# Altium integrated library A.Mohebbi.IntLib: 48 symbols (part 1 of 3)
Pins are listed as number, name and electrical type; pins without a type are passive.

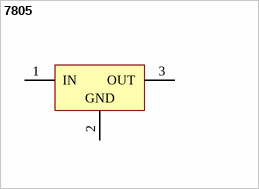
[diagram p0: symbol 7805]

## 7805
designator 7805, comment 7805CV  (value not drawn)
7805; LatestRevisionDate: 17-Jul-2002; LatestRevisionNote: Re-released for DXP Platform.; Publisher: Altium Limited
footprint TO_263
footprint TO_03
footprint TO_220_Right
footprint TO_220.
pins: 1 IN (power), 2 GND (power), 3 OUT (power)


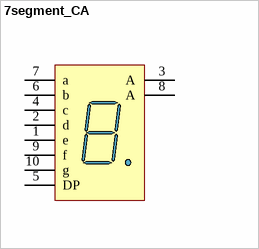
[diagram p1: symbol 7segment_CA]

## 7segment_CA
designator 7seg?  (value not drawn)
LatestRevisionDate: 17-Jul-2002; LatestRevisionNote: Re-released for DXP Platform.; Publisher: Altium Limited
footprint 7segment_CA
pins: 1 e "Cathode", 2 d "Cathode", 3 A "Common Anode", 4 c "Cathode", 5 DP "Cathode", 6 b "Cathode", 7 a "Cathode", 8 A "Common Anode", 9 f "Cathode", 10 g "Cathode"


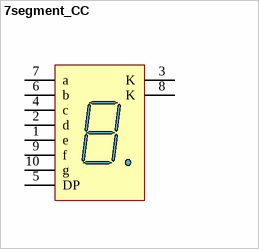
[diagram p2: symbol 7segment_CC]

## 7segment_CC
designator 7seg?  (value not drawn)
LatestRevisionDate: 17-Jul-2002; LatestRevisionNote: Re-released for DXP Platform.; Publisher: Altium Limited
footprint 7segment_CC
pins: 1 e "Anode", 2 d "Anode", 3 K "Common Cathode", 4 c "Anode", 5 DP "Anode", 6 b "Anode", 7 a "Anode", 8 K "Common Cathode", 9 f "Anode", 10 g "Anode"


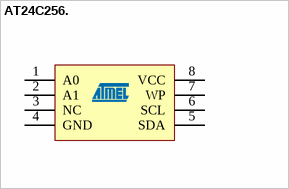
[diagram p3: symbol AT24C256.]

## AT24C256.
designator AT24C256, comment AT24C256  (value not drawn)
LatestRevisionDate: 17-Jul-2002; LatestRevisionNote: Re-released for DXP Platform.; Publisher: Altium Limited
footprint DIP_8
footprint SO_8
pins: 1 A0, 2 A1, 3 NC, 4 GND (power), 5 SDA, 6 SCL, 7 WP, 8 VCC (power)


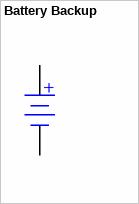
[diagram p4: symbol Battery Backup]

## Battery Backup
designator Battery  (value not drawn)
LatestRevisionDate: 17-Jul-2002; LatestRevisionNote: Re-released for DXP Platform.; Publisher: Altium Limited
footprint Cell Holder
footprint Cell Holder_SMD
pins: 1 + (power), 2 - (power)


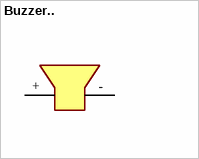
[diagram p5: symbol Buzzer..]

## Buzzer..
designator Buzzer, comment Buzzer  (value not drawn)
LatestRevisionDate: 17-Jul-2002; LatestRevisionNote: Re-released for DXP Platform.; Publisher: Altium Limited
footprint Buzzer
pins: + 1 (power), - 2 (power)


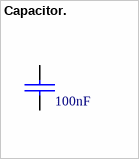
[diagram p6: symbol Capacitor.]

## Capacitor.
designator C?  value 100nF  (hidden comment: Capacitor.)
Capacitor; LatestRevisionDate: 17-Jul-2002; LatestRevisionNote: Re-released for DXP Platform.; Publisher: Altium Limited
footprint Cap-0805
footprint Cap_100nF
footprint Cap-0603
footprint Cap-1206
pins: 1, 2


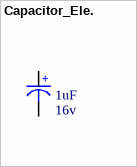
[diagram p7: symbol Capacitor_Ele.]

## Capacitor_Ele.
designator C?, comment value 1uF  Voltage: 16v  (hidden comment: Capacitor_Ele)
LatestRevisionDate: 17-Jul-2002; LatestRevisionNote: Re-released for DXP Platform.; Publisher: Altium Limited
footprint cap-ele-02.
footprint Cap-Ele-04.
footprint Cap_Ele_SMD
footprint Cap-Ele-01.
footprint Cap-Ele-03.
footprint Cap-Ele-05.
pins: 1 +, 2 -


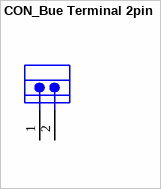
[diagram p8: symbol CON_Bue Terminal 2pin]

## CON_Bue Terminal 2pin
designator Conn, comment Bue Terminal 2pin  (value not drawn)
LatestRevisionDate: 17-Jul-2002; LatestRevisionNote: Re-released for DXP Platform.; Publisher: Altium Limited
footprint Bue Terminal_2 pin
footprint terminal-2pin
pins: 1, 2


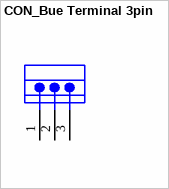
[diagram p9: symbol CON_Bue Terminal 3pin]

## CON_Bue Terminal 3pin
designator Conn, comment Bue Terminal 3pin  (value not drawn)
LatestRevisionDate: 17-Jul-2002; LatestRevisionNote: Re-released for DXP Platform.; Publisher: Altium Limited
footprint Bue Terminal_3 pin
pins: 1, 2, 3


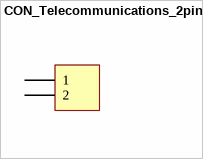
[diagram p10: symbol CON_Telecommunications_2pin]

## CON_Telecommunications_2pin
designator Conn, comment Telecommunications  (value not drawn)
LatestRevisionDate: 17-Jul-2002; LatestRevisionNote: Re-released for DXP Platform.; Publisher: Altium Limited
footprint Teleconn_2pin
footprint terminal-2pin
pins: 1, 2


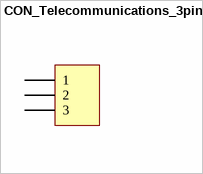
[diagram p11: symbol CON_Telecommunications_3pin]

## CON_Telecommunications_3pin
designator Conn, comment Telecommunications  (value not drawn)
LatestRevisionDate: 17-Jul-2002; LatestRevisionNote: Re-released for DXP Platform.; Publisher: Altium Limited
footprint Teleconn_3pin
pins: 1, 2, 3


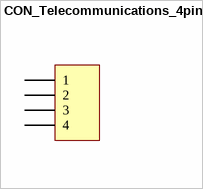
[diagram p12: symbol CON_Telecommunications_4pin]

## CON_Telecommunications_4pin
designator Conn, comment Telecommunications  (value not drawn)
LatestRevisionDate: 17-Jul-2002; LatestRevisionNote: Re-released for DXP Platform.; Publisher: Altium Limited
footprint Teleconn_4pin
pins: 1, 2, 3, 4


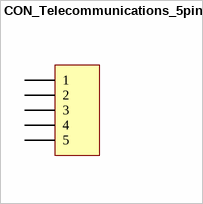
[diagram p13: symbol CON_Telecommunications_5pin]

## CON_Telecommunications_5pin
designator Conn, comment Telecommunications  (value not drawn)
LatestRevisionDate: 17-Jul-2002; LatestRevisionNote: Re-released for DXP Platform.; Publisher: Altium Limited
footprint Teleconn_5pin
pins: 1, 2, 3, 4, 5


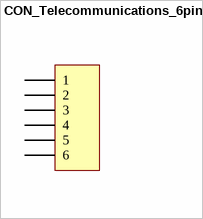
[diagram p14: symbol CON_Telecommunications_6pin]

## CON_Telecommunications_6pin
designator Conn, comment Telecommunications  (value not drawn)
LatestRevisionDate: 17-Jul-2002; LatestRevisionNote: Re-released for DXP Platform.; Publisher: Altium Limited
footprint Teleconn_6pin
pins: 1, 2, 3, 4, 5, 6


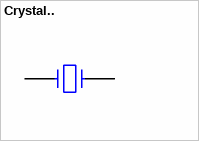
[diagram p15: symbol Crystal..]

## Crystal..
designator Crystal?, comment Crystal  (value not drawn)
LatestRevisionDate: 17-Jul-2002; LatestRevisionNote: Re-released for DXP Platform.; Publisher: Altium Limited
footprint Crystal_1
footprint Crystal_2
footprint Crystal_SMD.
pins: 1, 2


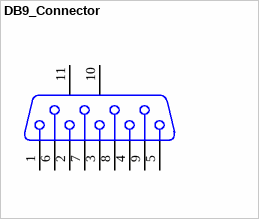
[diagram p16: symbol DB9_Connector]

## DB9_Connector
designator DB9, comment DB9 Connector  (value not drawn)
LatestRevisionDate: 17-Jul-2002; LatestRevisionNote: Re-released for DXP Platform.; Publisher: Altium Limited
footprint DB9_Male
footprint DB9_Female
pins: 1, 2, 3, 4, 5, 6, 7, 8, 9, 10 MH1, 11 MH2


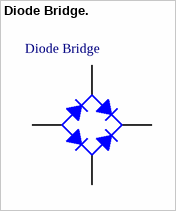
[diagram p17: symbol Diode Bridge.]

## Diode Bridge.
designator Diode Bridge, comment Diode Bridge  (value not drawn)
Diode Bridge.
footprint Diode Bridge.1
footprint Diode Bridge.2
pins: 1 K, 2 C, 3 A, 4 C


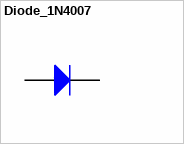
[diagram p18: symbol Diode_1N4007]

## Diode_1N4007
designator D?, comment Diode 1N4007  (value not drawn)
LatestRevisionDate: 17-Jul-2002; LatestRevisionNote: Re-released for DXP Platform.; Publisher: Altium Limited
footprint DO_41
footprint DO_41_Stand
pins: 1 A, 2 K


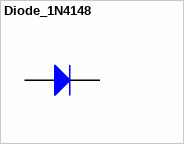
[diagram p19: symbol Diode_1N4148]

## Diode_1N4148
designator D?  (value not drawn)
Diode 1N4148; LatestRevisionDate: 17-Jul-2002; LatestRevisionNote: Re-released for DXP Platform.; Publisher: Altium Limited
footprint DO_35
footprint DO_35_Stand
pins: 1 A, 2 K


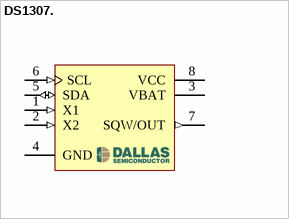
[diagram p20: symbol DS1307.]

## DS1307.
designator DS1307, comment DS1307  (value not drawn)
LatestRevisionDate: 17-Jul-2002; LatestRevisionNote: Re-released for DXP Platform.; Publisher: Altium Limited
footprint DIP_8
footprint SO_8
pins: 1 X1 (in), 2 X2 (in), 3 VBAT (power), 4 GND (power), 5 SDA (io), 6 SCL (in), 7 SQW/OUT (out), 8 VCC (power)


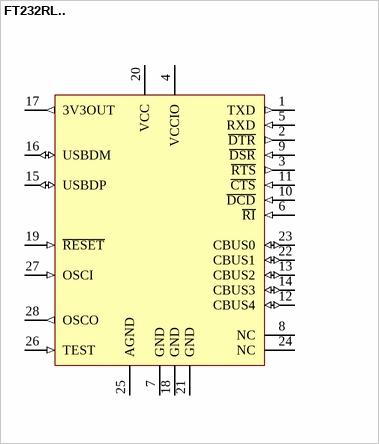
[diagram p21: symbol FT232RL..]

## FT232RL..
designator FT232RL, comment FT232RL  (value not drawn)
LatestRevisionDate: 17-Jul-2002; LatestRevisionNote: Re-released for DXP Platform.; Publisher: Altium Limited
footprint SSOP_28
pins: 1 TXD (out), 2 ~{DTR} (out), 3 ~{RTS} (out), 4 VCCIO (power), 5 RXD (in), 6 ~{RI} (in), 7 GND (power), 8 NC, 9 ~{DSR} (in), 10 ~{DCD} (in), 11 ~{CTS} (in), 12 CBUS4 (io), 13 CBUS2 (io), 14 CBUS3 (io), 15 USBDP (io), 16 USBDM (io), 17 3V3OUT (out), 18 GND (power), 19 ~{RESET} (in), 20 VCC (power), 21 GND (power), 22 CBUS1 (io), 23 CBUS0 (io), 24 NC, 25 AGND (power), 26 TEST (in), 27 OSCI (in), 28 OSCO (out)


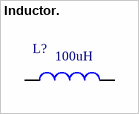
[diagram p22: symbol Inductor.]

## Inductor.
designator L?  value 100uH  (hidden comment: Inductor.)
footprint Inductor.
pins: 1, 2
